# Altium schematic symbol library FPGA_Xilinx_Virtex5.SchLib: 41 symbols (part 6 of 27)
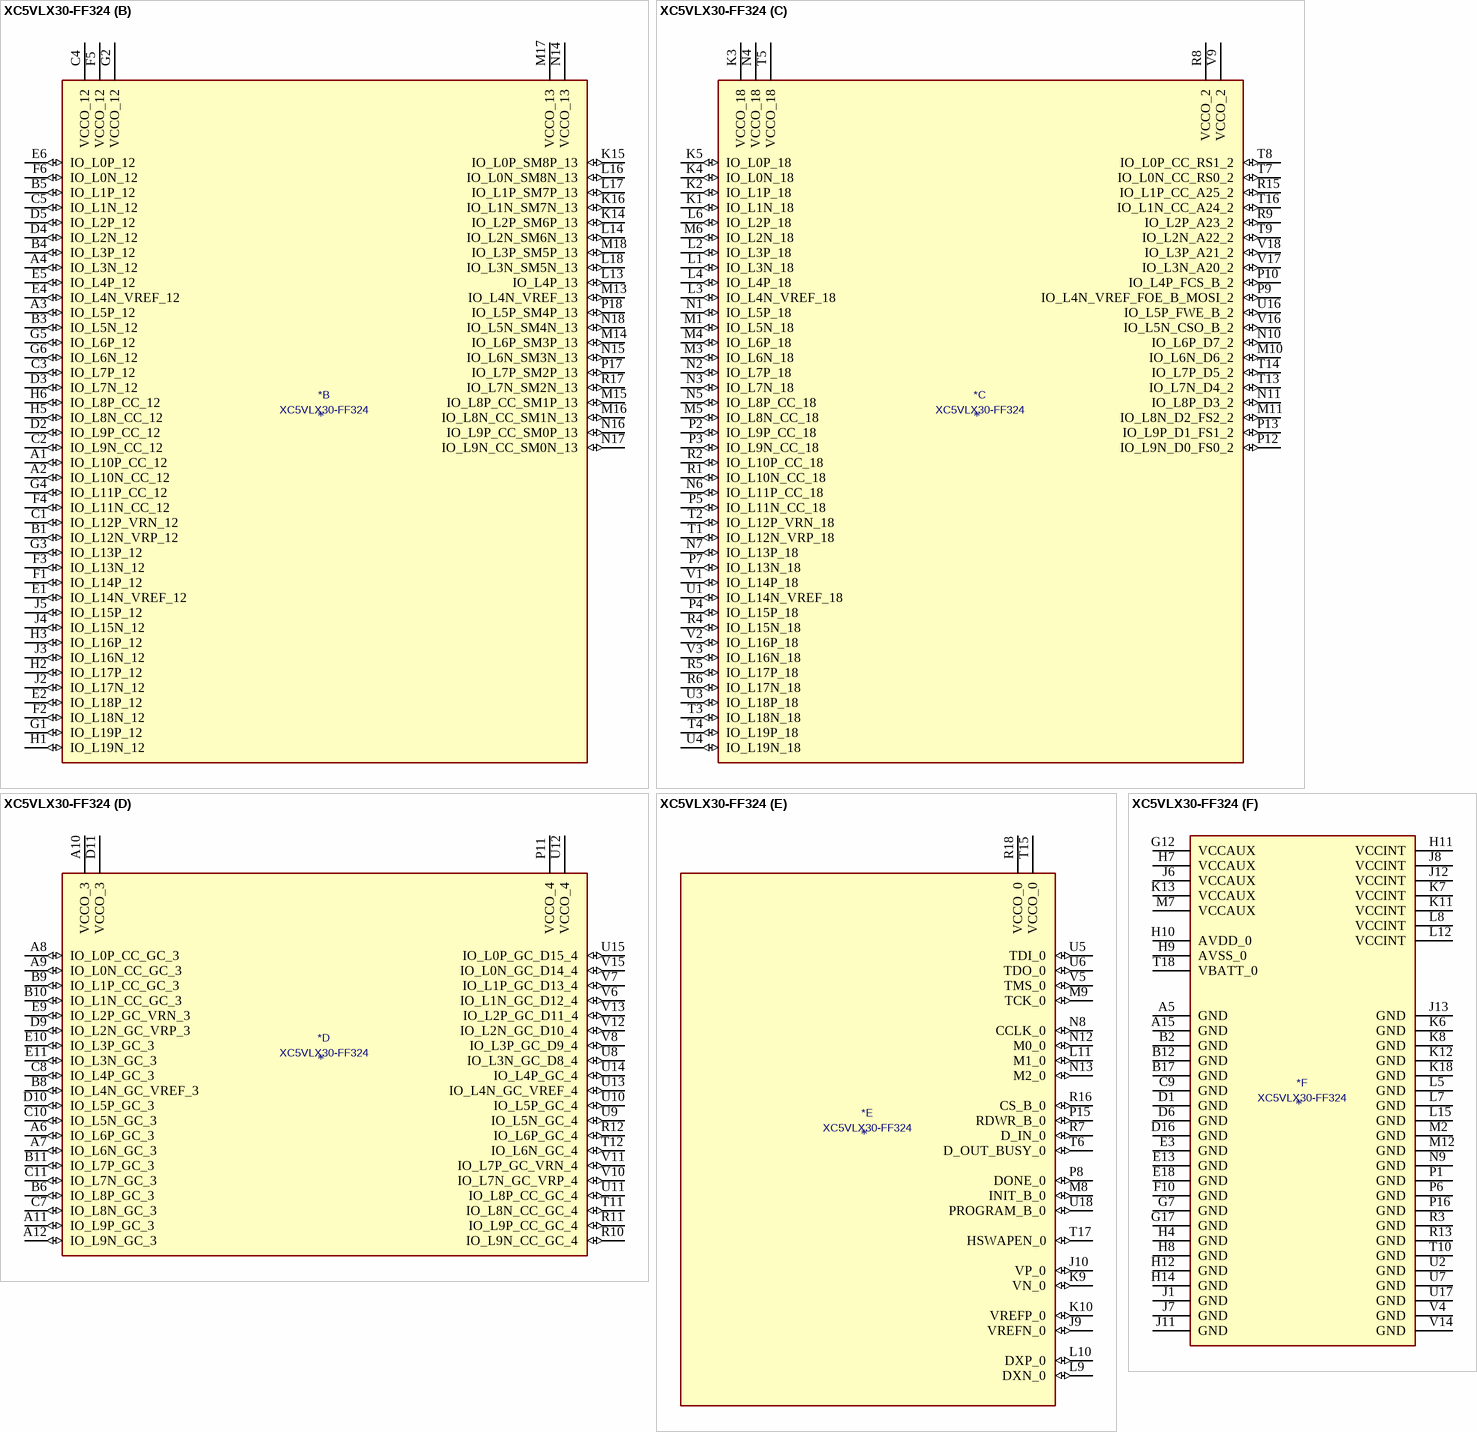
[diagram p142: symbol XC5VLX30-FF324]

## XC5VLX30-FF324
designator *  value XC5VLX30-FF324
ki_keywords: FPGA; ki_description: Virtex 5 LX 30 XC5VLX30-FF324
part A pins: A13 IO_L1P_11 (io), A14 IO_L1N_11 (io), A16 IO_L3N_11 (io), A17 IO_L5P_11 (io), A18 IO_L5N_11 (io), B7 VCCO_1 (power), B13 IO_L6N_11 (io), B14 IO_L2P_11 (io), B15 IO_L2N_11 (io), B16 IO_L3P_11 (io), B18 IO_L7P_11 (io), C6 IO_L9N_CC_A0_D16_1 (io), C12 IO_L4P_A11_D27_1 (io), C13 IO_L6P_11 (io), C14 VCCO_11 (power), C15 IO_L0P_11 (io), C16 IO_L0N_11 (io), C17 IO_L7N_11 (io), C18 IO_L12N_VRP_11 (io), D7 IO_L9P_CC_A1_D17_1 (io), D8 IO_L7P_A5_D21_1 (io), D12 IO_L2N_A14_D30_1 (io), D13 IO_L4N_VREF_A10_D26_1 (io), D14 IO_L4P_11 (io), D15 IO_L11P_CC_SM14P_11 (io), D17 IO_L10N_CC_SM15N_11 (io), D18 IO_L12P_VRN_11 (io), E7 IO_L7N_A4_D20_1 (io), E8 VCCO_1 (power), E12 IO_L2P_A15_D31_1 (io), E14 IO_L4N_VREF_11 (io), E15 IO_L11N_CC_SM14N_11 (io), E16 IO_L9N_CC_11 (io), E17 IO_L10P_CC_SM15P_11 (io), F7 IO_L5N_A8_D24_1 (io), F8 IO_L3P_A13_D29_1 (io), F9 IO_L1N_A16_1 (io), F11 IO_L0P_A19_1 (io), F12 IO_L6P_A7_D23_1 (io), F13 IO_L6N_A6_D22_1 (io), F14 IO_L8P_CC_11 (io), F15 VCCO_11 (power), F16 IO_L9P_CC_11 (io), F17 IO_L14N_VREF_11 (io), F18 IO_L14P_11 (io), G8 IO_L5P_A9_D25_1 (io), G9 IO_L3N_A12_D28_1 (io), G10 IO_L1P_A17_1 (io), G11 IO_L0N_A18_1 (io), G13 IO_L8P_CC_A3_D19_1 (io), G14 IO_L8N_CC_11 (io), G15 IO_L13N_11 (io), G16 IO_L15N_SM13N_11 (io), G18 IO_L16N_SM12N_11 (io), H13 IO_L8N_CC_A2_D18_1 (io), H15 IO_L13P_11 (io), H16 IO_L15P_SM13P_11 (io), H17 IO_L17P_SM11P_11 (io), H18 IO_L16P_SM12P_11 (io), J14 IO_L19N_SM9N_11 (io), J15 IO_L19P_SM9P_11 (io), J16 VCCO_11 (power), J17 IO_L17N_SM11N_11 (io), J18 IO_L18N_SM10N_11 (io), K17 IO_L18P_SM10P_11 (io)
part B pins: A1 IO_L10P_CC_12 (io), A2 IO_L10N_CC_12 (io), A3 IO_L5P_12 (io), A4 IO_L3N_12 (io), B1 IO_L12N_VRP_12 (io), B3 IO_L5N_12 (io), B4 IO_L3P_12 (io), B5 IO_L1P_12 (io), C1 IO_L12P_VRN_12 (io), C2 IO_L9N_CC_12 (io), C3 IO_L7P_12 (io), C4 VCCO_12 (power), C5 IO_L1N_12 (io), D2 IO_L9P_CC_12 (io), D3 IO_L7N_12 (io), D4 IO_L2N_12 (io), D5 IO_L2P_12 (io), E1 IO_L14N_VREF_12 (io), E2 IO_L18P_12 (io), E4 IO_L4N_VREF_12 (io), E5 IO_L4P_12 (io), E6 IO_L0P_12 (io), F1 IO_L14P_12 (io), F2 IO_L18N_12 (io), F3 IO_L13N_12 (io), F4 IO_L11N_CC_12 (io), F5 VCCO_12 (power), F6 IO_L0N_12 (io), G1 IO_L19P_12 (io), G2 VCCO_12 (power), G3 IO_L13P_12 (io), G4 IO_L11P_CC_12 (io), G5 IO_L6P_12 (io), G6 IO_L6N_12 (io), H1 IO_L19N_12 (io), H2 IO_L17P_12 (io), H3 IO_L16P_12 (io), H5 IO_L8N_CC_12 (io), H6 IO_L8P_CC_12 (io), J2 IO_L17N_12 (io), J3 IO_L16N_12 (io), J4 IO_L15N_12 (io), J5 IO_L15P_12 (io), K14 IO_L2P_SM6P_13 (io), K15 IO_L0P_SM8P_13 (io), K16 IO_L1N_SM7N_13 (io), L13 IO_L4P_13 (io), L14 IO_L2N_SM6N_13 (io), L16 IO_L0N_SM8N_13 (io), L17 IO_L1P_SM7P_13 (io), L18 IO_L3N_SM5N_13 (io), M13 IO_L4N_VREF_13 (io), M14 IO_L6P_SM3P_13 (io), M15 IO_L8P_CC_SM1P_13 (io), M16 IO_L8N_CC_SM1N_13 (io), M17 VCCO_13 (power), M18 IO_L3P_SM5P_13 (io), N14 VCCO_13 (power), N15 IO_L6N_SM3N_13 (io), N16 IO_L9P_CC_SM0P_13 (io), N17 IO_L9N_CC_SM0N_13 (io), N18 IO_L5N_SM4N_13 (io), P17 IO_L7P_SM2P_13 (io), P18 IO_L5P_SM4P_13 (io), R17 IO_L7N_SM2N_13 (io)
part C pins: K1 IO_L1N_18 (io), K2 IO_L1P_18 (io), K3 VCCO_18 (power), K4 IO_L0N_18 (io), K5 IO_L0P_18 (io), L1 IO_L3N_18 (io), L2 IO_L3P_18 (io), L3 IO_L4N_VREF_18 (io), L4 IO_L4P_18 (io), L6 IO_L2P_18 (io), M1 IO_L5N_18 (io), M3 IO_L6N_18 (io), M4 IO_L6P_18 (io), M5 IO_L8N_CC_18 (io), M6 IO_L2N_18 (io), M10 IO_L6N_D6_2 (io), M11 IO_L8N_D2_FS2_2 (io), N1 IO_L5P_18 (io), N2 IO_L7P_18 (io), N3 IO_L7N_18 (io), N4 VCCO_18 (power), N5 IO_L8P_CC_18 (io), N6 IO_L11P_CC_18 (io), N7 IO_L13P_18 (io), N10 IO_L6P_D7_2 (io), N11 IO_L8P_D3_2 (io), P2 IO_L9P_CC_18 (io), P3 IO_L9N_CC_18 (io), P4 IO_L15P_18 (io), P5 IO_L11N_CC_18 (io), P7 IO_L13N_18 (io), P9 IO_L4N_VREF_FOE_B_MOSI_2 (io), P10 IO_L4P_FCS_B_2 (io), P12 IO_L9N_D0_FS0_2 (io), P13 IO_L9P_D1_FS1_2 (io), R1 IO_L10N_CC_18 (io), R2 IO_L10P_CC_18 (io), R4 IO_L15N_18 (io), R5 IO_L17P_18 (io), R6 IO_L17N_18 (io), R8 VCCO_2 (power), R9 IO_L2P_A23_2 (io), R15 IO_L1P_CC_A25_2 (io), T1 IO_L12N_VRP_18 (io), T2 IO_L12P_VRN_18 (io), T3 IO_L18N_18 (io), T4 IO_L19P_18 (io), T5 VCCO_18 (power), T7 IO_L0N_CC_RS0_2 (io), T8 IO_L0P_CC_RS1_2 (io), T9 IO_L2N_A22_2 (io), T13 IO_L7N_D4_2 (io), T14 IO_L7P_D5_2 (io), T16 IO_L1N_CC_A24_2 (io), U1 IO_L14N_VREF_18 (io), U3 IO_L18P_18 (io), U4 IO_L19N_18 (io), U16 IO_L5P_FWE_B_2 (io), V1 IO_L14P_18 (io), V2 IO_L16P_18 (io), V3 IO_L16N_18 (io), V9 VCCO_2 (power), V16 IO_L5N_CSO_B_2 (io), V17 IO_L3N_A20_2 (io), V18 IO_L3P_A21_2 (io)
part D pins: A6 IO_L6P_GC_3 (io), A7 IO_L6N_GC_3 (io), A8 IO_L0P_CC_GC_3 (io), A9 IO_L0N_CC_GC_3 (io), A10 VCCO_3 (power), A11 IO_L9P_GC_3 (io), A12 IO_L9N_GC_3 (io), B6 IO_L8P_GC_3 (io), B8 IO_L4N_GC_VREF_3 (io), B9 IO_L1P_CC_GC_3 (io), B10 IO_L1N_CC_GC_3 (io), B11 IO_L7P_GC_3 (io), C7 IO_L8N_GC_3 (io), C8 IO_L4P_GC_3 (io), C10 IO_L5N_GC_3 (io), C11 IO_L7N_GC_3 (io), D9 IO_L2N_GC_VRP_3 (io), D10 IO_L5P_GC_3 (io), D11 VCCO_3 (power), E9 IO_L2P_GC_VRN_3 (io), E10 IO_L3P_GC_3 (io), E11 IO_L3N_GC_3 (io), P11 VCCO_4 (power), R10 IO_L9N_CC_GC_4 (io), R11 IO_L9P_CC_GC_4 (io), R12 IO_L6P_GC_4 (io), T11 IO_L8N_CC_GC_4 (io), T12 IO_L6N_GC_4 (io), U8 IO_L3N_GC_D8_4 (io), U9 IO_L5N_GC_4 (io), U10 IO_L5P_GC_4 (io), U11 IO_L8P_CC_GC_4 (io), U12 VCCO_4 (power), U13 IO_L4N_GC_VREF_4 (io), U14 IO_L4P_GC_4 (io), U15 IO_L0P_GC_D15_4 (io), V6 IO_L1N_GC_D12_4 (io), V7 IO_L1P_GC_D13_4 (io), V8 IO_L3P_GC_D9_4 (io), V10 IO_L7N_GC_VRP_4 (io), V11 IO_L7P_GC_VRN_4 (io), V12 IO_L2N_GC_D10_4 (io), V13 IO_L2P_GC_D11_4 (io), V15 IO_L0N_GC_D14_4 (io)
part E pins: J9 VREFN_0 (io), J10 VP_0 (io), K9 VN_0 (io), K10 VREFP_0 (io), L9 DXN_0 (io), L10 DXP_0 (io), L11 M1_0 (io), M8 INIT_B_0 (io), M9 TCK_0 (io), N8 CCLK_0 (io), N12 M0_0 (io), N13 M2_0 (io), P8 DONE_0 (io), P15 RDWR_B_0 (io), R7 D_IN_0 (io), R16 CS_B_0 (io), R18 VCCO_0 (power), T6 D_OUT_BUSY_0 (io), T15 VCCO_0 (power), T17 HSWAPEN_0 (io), U5 TDI_0 (io), U6 TDO_0 (io), U18 PROGRAM_B_0 (io), V5 TMS_0 (io)
part F pins: A5 GND (power), A15 GND (power), B2 GND (power), B12 GND (power), B17 GND (power), C9 GND (power), D1 GND (power), D6 GND (power), D16 GND (power), E3 GND (power), E13 GND (power), E18 GND (power), F10 GND (power), G7 GND (power), G12 VCCAUX (power), G17 GND (power), H4 GND (power), H7 VCCAUX (power), H8 GND (power), H9 AVSS_0 (power), H10 AVDD_0 (power), H11 VCCINT (power), H12 GND (power), H14 GND (power), J1 GND (power), J6 VCCAUX (power), J7 GND (power), J8 VCCINT (power), J11 GND (power), J12 VCCINT (power), J13 GND (power), K6 GND (power), K7 VCCINT (power), K8 GND (power), K11 VCCINT (power), K12 GND (power), K13 VCCAUX (power), K18 GND (power), L5 GND (power), L7 GND (power), L8 VCCINT (power), L12 VCCINT (power), L15 GND (power), M2 GND (power), M7 VCCAUX (power), M12 GND (power), N9 GND (power), P1 GND (power), P6 GND (power), P16 GND (power), R3 GND (power), R13 GND (power), T10 GND (power), T18 VBATT_0 (power), U2 GND (power), U7 GND (power), U17 GND (power), V4 GND (power), V14 GND (power)

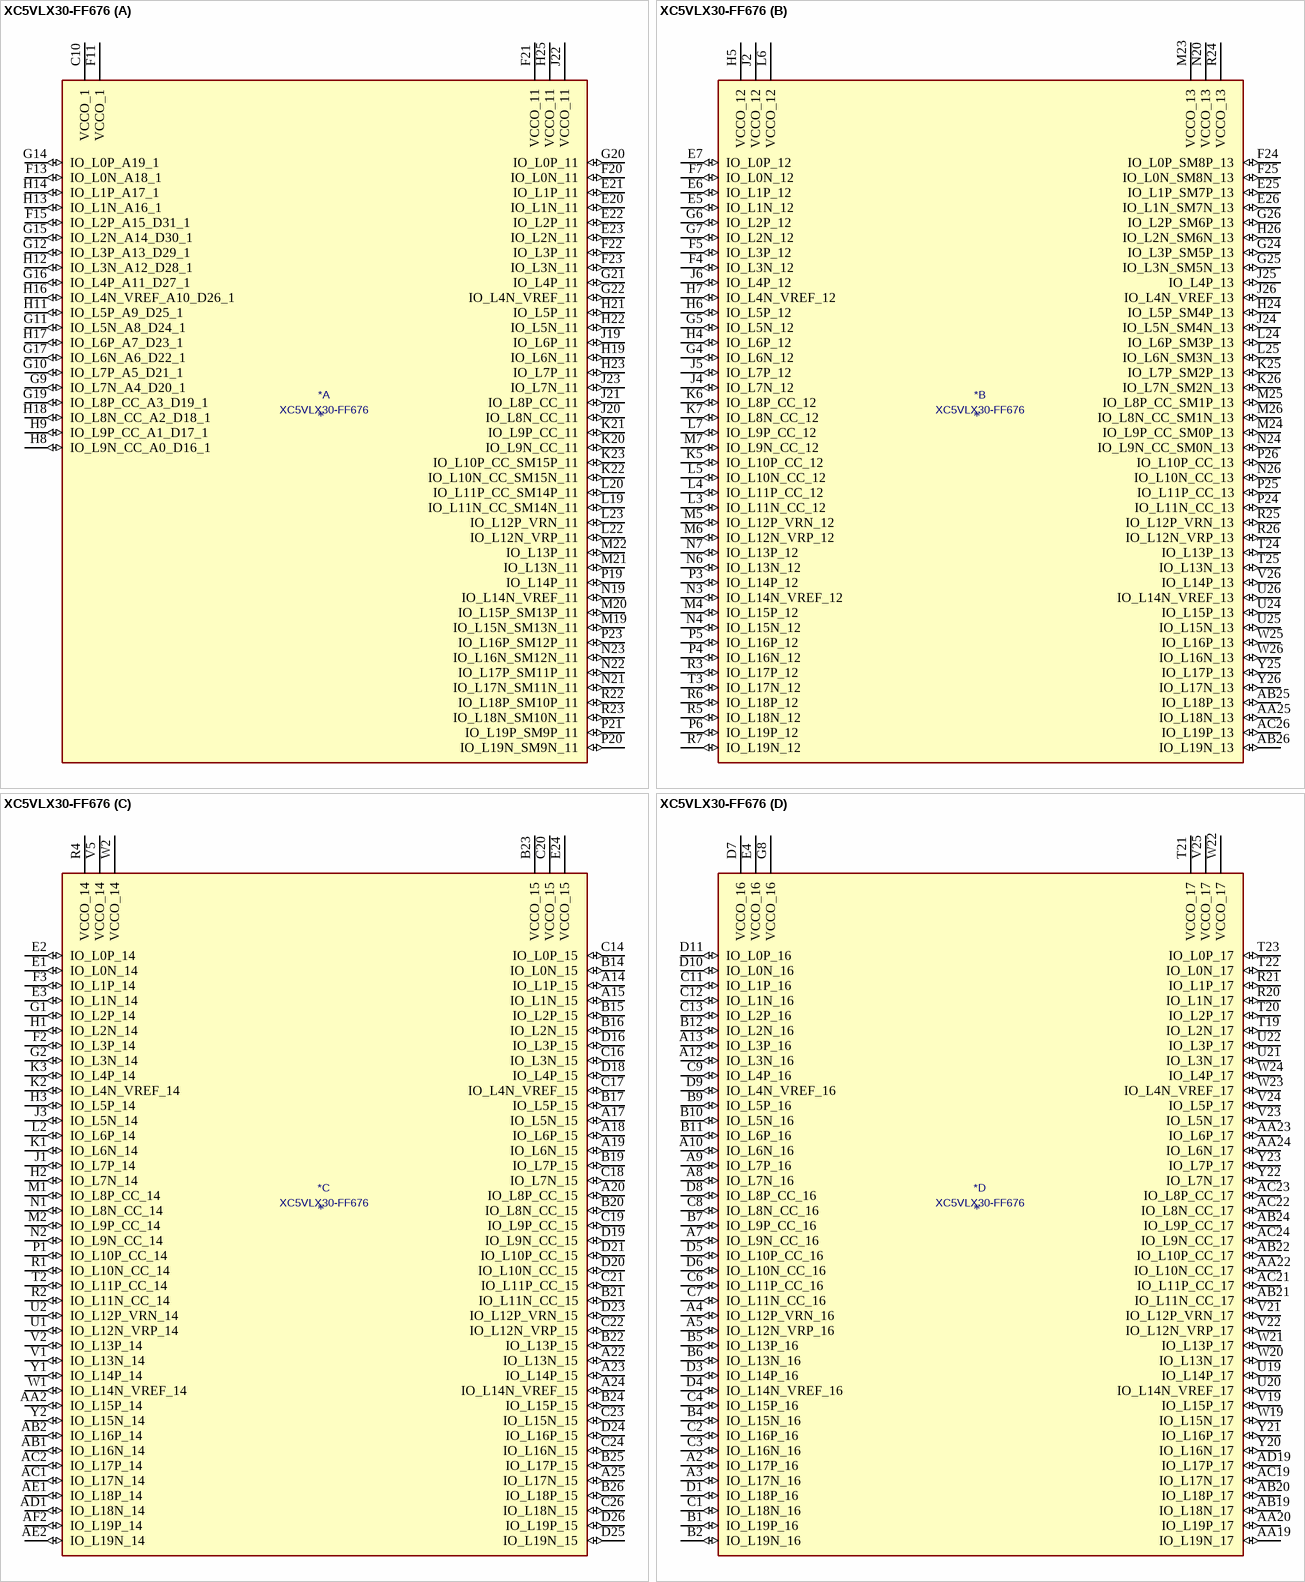
[diagram p28: symbol XC5VLX30-FF676]

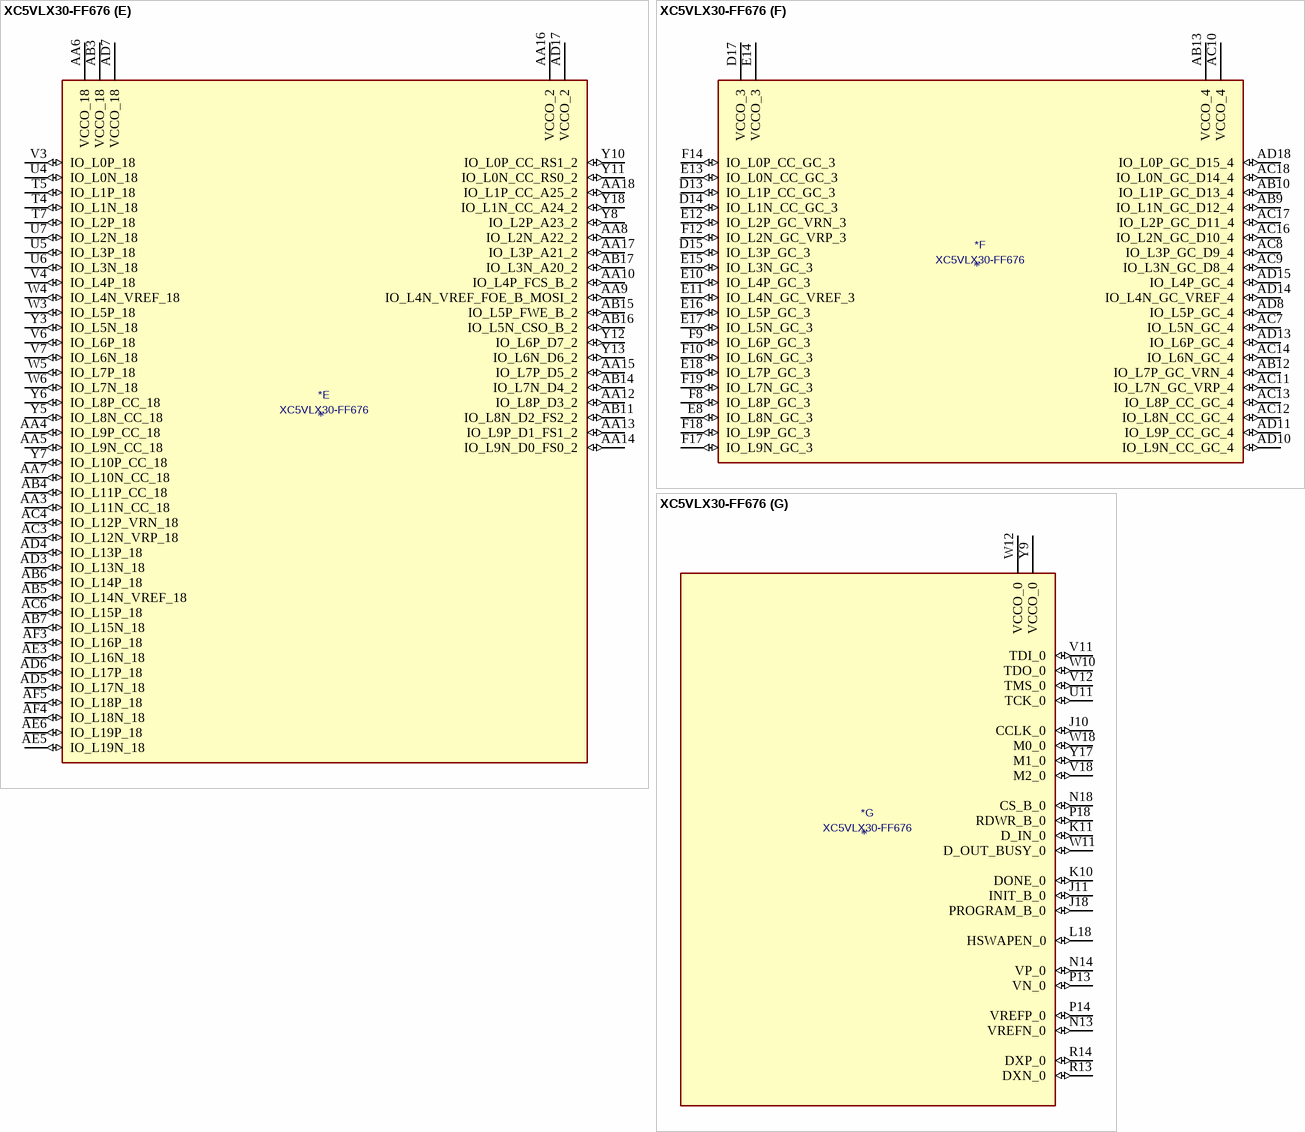
[diagram p29: symbol XC5VLX30-FF676]

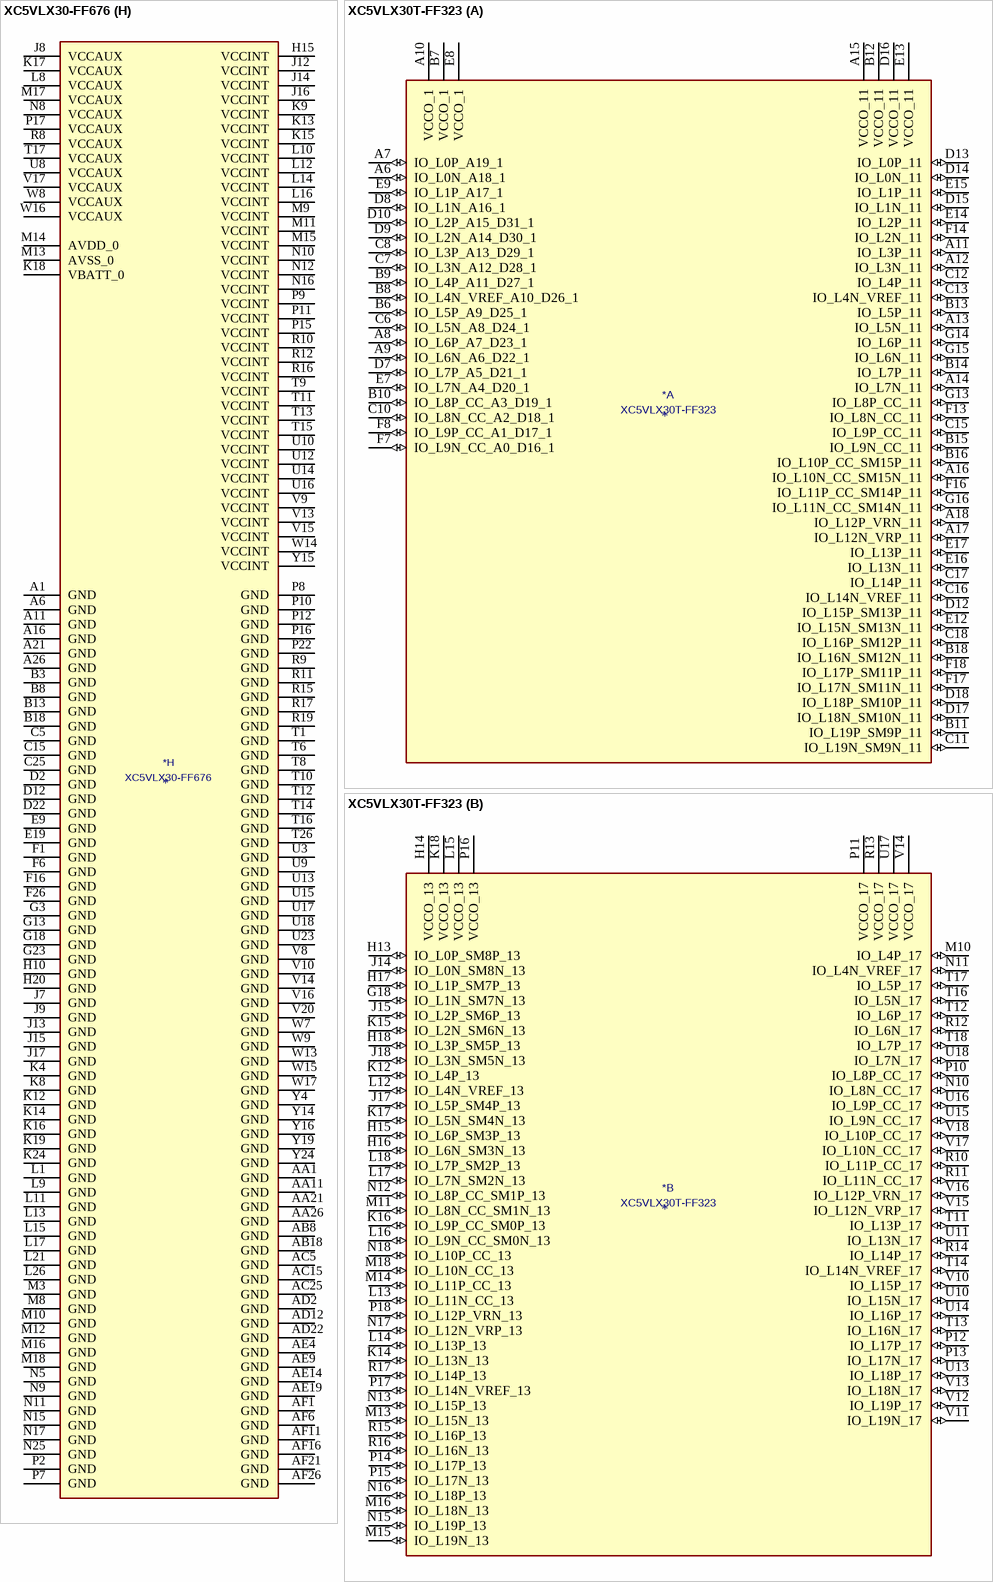
[diagram p30: symbols XC5VLX30-FF676 to XC5VLX30T-FF323]

## XC5VLX30-FF676
designator *  value XC5VLX30-FF676
ki_keywords: FPGA; ki_description: Virtex 5 LX 30 XC5VLX30-FF676
part A pins: C10 VCCO_1 (power), E20 IO_L1N_11 (io), E21 IO_L1P_11 (io), E22 IO_L2P_11 (io), E23 IO_L2N_11 (io), F11 VCCO_1 (power), F13 IO_L0N_A18_1 (io), F15 IO_L2P_A15_D31_1 (io), F20 IO_L0N_11 (io), F21 VCCO_11 (power), F22 IO_L3P_11 (io), F23 IO_L3N_11 (io), G9 IO_L7N_A4_D20_1 (io), G10 IO_L7P_A5_D21_1 (io), G11 IO_L5N_A8_D24_1 (io), G12 IO_L3P_A13_D29_1 (io), G14 IO_L0P_A19_1 (io), G15 IO_L2N_A14_D30_1 (io), G16 IO_L4P_A11_D27_1 (io), G17 IO_L6N_A6_D22_1 (io), G19 IO_L8P_CC_A3_D19_1 (io), G20 IO_L0P_11 (io), G21 IO_L4P_11 (io), G22 IO_L4N_VREF_11 (io), H8 IO_L9N_CC_A0_D16_1 (io), H9 IO_L9P_CC_A1_D17_1 (io), H11 IO_L5P_A9_D25_1 (io), H12 IO_L3N_A12_D28_1 (io), H13 IO_L1N_A16_1 (io), H14 IO_L1P_A17_1 (io), H16 IO_L4N_VREF_A10_D26_1 (io), H17 IO_L6P_A7_D23_1 (io), H18 IO_L8N_CC_A2_D18_1 (io), H19 IO_L6N_11 (io), H21 IO_L5P_11 (io), H22 IO_L5N_11 (io), H23 IO_L7P_11 (io), H25 VCCO_11 (power), J19 IO_L6P_11 (io), J20 IO_L8N_CC_11 (io), J21 IO_L8P_CC_11 (io), J22 VCCO_11 (power), J23 IO_L7N_11 (io), K20 IO_L9N_CC_11 (io), K21 IO_L9P_CC_11 (io), K22 IO_L10N_CC_SM15N_11 (io), K23 IO_L10P_CC_SM15P_11 (io), L19 IO_L11N_CC_SM14N_11 (io), L20 IO_L11P_CC_SM14P_11 (io), L22 IO_L12N_VRP_11 (io), L23 IO_L12P_VRN_11 (io), M19 IO_L15N_SM13N_11 (io), M20 IO_L15P_SM13P_11 (io), M21 IO_L13N_11 (io), M22 IO_L13P_11 (io), N19 IO_L14N_VREF_11 (io), N21 IO_L17N_SM11N_11 (io), N22 IO_L17P_SM11P_11 (io), N23 IO_L16N_SM12N_11 (io), P19 IO_L14P_11 (io), P20 IO_L19N_SM9N_11 (io), P21 IO_L19P_SM9P_11 (io), P23 IO_L16P_SM12P_11 (io), R22 IO_L18P_SM10P_11 (io), R23 IO_L18N_SM10N_11 (io)
part B pins: AA25 IO_L18N_13 (io), AB25 IO_L18P_13 (io), AB26 IO_L19N_13 (io), AC26 IO_L19P_13 (io), E5 IO_L1N_12 (io), E6 IO_L1P_12 (io), E7 IO_L0P_12 (io), E25 IO_L1P_SM7P_13 (io), E26 IO_L1N_SM7N_13 (io), F4 IO_L3N_12 (io), F5 IO_L3P_12 (io), F7 IO_L0N_12 (io), F24 IO_L0P_SM8P_13 (io), F25 IO_L0N_SM8N_13 (io), G4 IO_L6N_12 (io), G5 IO_L5N_12 (io), G6 IO_L2P_12 (io), G7 IO_L2N_12 (io), G24 IO_L3P_SM5P_13 (io), G25 IO_L3N_SM5N_13 (io), G26 IO_L2P_SM6P_13 (io), H4 IO_L6P_12 (io), H5 VCCO_12 (power), H6 IO_L5P_12 (io), H7 IO_L4N_VREF_12 (io), H24 IO_L5P_SM4P_13 (io), H26 IO_L2N_SM6N_13 (io), J2 VCCO_12 (power), J4 IO_L7N_12 (io), J5 IO_L7P_12 (io), J6 IO_L4P_12 (io), J24 IO_L5N_SM4N_13 (io), J25 IO_L4P_13 (io), J26 IO_L4N_VREF_13 (io), K5 IO_L10P_CC_12 (io), K6 IO_L8P_CC_12 (io), K7 IO_L8N_CC_12 (io), K25 IO_L7P_SM2P_13 (io), K26 IO_L7N_SM2N_13 (io), L3 IO_L11N_CC_12 (io), L4 IO_L11P_CC_12 (io), L5 IO_L10N_CC_12 (io), L6 VCCO_12 (power), L7 IO_L9P_CC_12 (io), L24 IO_L6P_SM3P_13 (io), L25 IO_L6N_SM3N_13 (io), M4 IO_L15P_12 (io), M5 IO_L12P_VRN_12 (io), M6 IO_L12N_VRP_12 (io), M7 IO_L9N_CC_12 (io), M23 VCCO_13 (power), M24 IO_L9P_CC_SM0P_13 (io), M25 IO_L8P_CC_SM1P_13 (io), M26 IO_L8N_CC_SM1N_13 (io), N3 IO_L14N_VREF_12 (io), N4 IO_L15N_12 (io), N6 IO_L13N_12 (io), N7 IO_L13P_12 (io), N20 VCCO_13 (power), N24 IO_L9N_CC_SM0N_13 (io), N26 IO_L10N_CC_13 (io), P3 IO_L14P_12 (io), P4 IO_L16N_12 (io), P5 IO_L16P_12 (io), P6 IO_L19P_12 (io), P24 IO_L11N_CC_13 (io), P25 IO_L11P_CC_13 (io), P26 IO_L10P_CC_13 (io), R3 IO_L17P_12 (io), R5 IO_L18N_12 (io), R6 IO_L18P_12 (io), R7 IO_L19N_12 (io), R24 VCCO_13 (power), R25 IO_L12P_VRN_13 (io), R26 IO_L12N_VRP_13 (io), T3 IO_L17N_12 (io), T24 IO_L13P_13 (io), T25 IO_L13N_13 (io), U24 IO_L15P_13 (io), U25 IO_L15N_13 (io), U26 IO_L14N_VREF_13 (io), V26 IO_L14P_13 (io), W25 IO_L16P_13 (io), W26 IO_L16N_13 (io), Y25 IO_L17P_13 (io), Y26 IO_L17N_13 (io)
part C pins: A14 IO_L1P_15 (io), A15 IO_L1N_15 (io), A17 IO_L5N_15 (io), A18 IO_L6P_15 (io), A19 IO_L6N_15 (io), A20 IO_L8P_CC_15 (io), A22 IO_L13N_15 (io), A23 IO_L14P_15 (io), A24 IO_L14N_VREF_15 (io), A25 IO_L17N_15 (io), AA2 IO_L15P_14 (io), AB1 IO_L16N_14 (io), AB2 IO_L16P_14 (io), AC1 IO_L17N_14 (io), AC2 IO_L17P_14 (io), AD1 IO_L18N_14 (io), AE1 IO_L18P_14 (io), AE2 IO_L19N_14 (io), AF2 IO_L19P_14 (io), B14 IO_L0N_15 (io), B15 IO_L2P_15 (io), B16 IO_L2N_15 (io), B17 IO_L5P_15 (io), B19 IO_L7P_15 (io), B20 IO_L8N_CC_15 (io), B21 IO_L11N_CC_15 (io), B22 IO_L13P_15 (io), B23 VCCO_15 (power), B24 IO_L15P_15 (io), B25 IO_L17P_15 (io), B26 IO_L18P_15 (io), C14 IO_L0P_15 (io), C16 IO_L3N_15 (io), C17 IO_L4N_VREF_15 (io), C18 IO_L7N_15 (io), C19 IO_L9P_CC_15 (io), C20 VCCO_15 (power), C21 IO_L11P_CC_15 (io), C22 IO_L12N_VRP_15 (io), C23 IO_L15N_15 (io), C24 IO_L16N_15 (io), C26 IO_L18N_15 (io), D16 IO_L3P_15 (io), D18 IO_L4P_15 (io), D19 IO_L9N_CC_15 (io), D20 IO_L10N_CC_15 (io), D21 IO_L10P_CC_15 (io), D23 IO_L12P_VRN_15 (io), D24 IO_L16P_15 (io), D25 IO_L19N_15 (io), D26 IO_L19P_15 (io), E1 IO_L0N_14 (io), E2 IO_L0P_14 (io), E3 IO_L1N_14 (io), E24 VCCO_15 (power), F2 IO_L3P_14 (io), F3 IO_L1P_14 (io), G1 IO_L2P_14 (io), G2 IO_L3N_14 (io), H1 IO_L2N_14 (io), H2 IO_L7N_14 (io), H3 IO_L5P_14 (io), J1 IO_L7P_14 (io), J3 IO_L5N_14 (io), K1 IO_L6N_14 (io), K2 IO_L4N_VREF_14 (io), K3 IO_L4P_14 (io), L2 IO_L6P_14 (io), M1 IO_L8P_CC_14 (io), M2 IO_L9P_CC_14 (io), N1 IO_L8N_CC_14 (io), N2 IO_L9N_CC_14 (io), P1 IO_L10P_CC_14 (io), R1 IO_L10N_CC_14 (io), R2 IO_L11N_CC_14 (io), R4 VCCO_14 (power), T2 IO_L11P_CC_14 (io), U1 IO_L12N_VRP_14 (io), U2 IO_L12P_VRN_14 (io), V1 IO_L13N_14 (io), V2 IO_L13P_14 (io), V5 VCCO_14 (power), W1 IO_L14N_VREF_14 (io), W2 VCCO_14 (power), Y1 IO_L14P_14 (io), Y2 IO_L15N_14 (io)
part D pins: A2 IO_L17P_16 (io), A3 IO_L17N_16 (io), A4 IO_L12P_VRN_16 (io), A5 IO_L12N_VRP_16 (io), A7 IO_L9N_CC_16 (io), A8 IO_L7N_16 (io), A9 IO_L7P_16 (io), A10 IO_L6N_16 (io), A12 IO_L3N_16 (io), A13 IO_L3P_16 (io), AA19 IO_L19N_17 (io), AA20 IO_L19P_17 (io), AA22 IO_L10N_CC_17 (io), AA23 IO_L6P_17 (io), AA24 IO_L6N_17 (io), AB19 IO_L18N_17 (io), AB20 IO_L18P_17 (io), AB21 IO_L11N_CC_17 (io), AB22 IO_L10P_CC_17 (io), AB24 IO_L9P_CC_17 (io), AC19 IO_L17N_17 (io), AC21 IO_L11P_CC_17 (io), AC22 IO_L8N_CC_17 (io), AC23 IO_L8P_CC_17 (io), AC24 IO_L9N_CC_17 (io), AD19 IO_L17P_17 (io), B1 IO_L19P_16 (io), B2 IO_L19N_16 (io), B4 IO_L15N_16 (io), B5 IO_L13P_16 (io), B6 IO_L13N_16 (io), B7 IO_L9P_CC_16 (io), B9 IO_L5P_16 (io), B10 IO_L5N_16 (io), B11 IO_L6P_16 (io), B12 IO_L2N_16 (io), C1 IO_L18N_16 (io), C2 IO_L16P_16 (io), C3 IO_L16N_16 (io), C4 IO_L15P_16 (io), C6 IO_L11P_CC_16 (io), C7 IO_L11N_CC_16 (io), C8 IO_L8N_CC_16 (io), C9 IO_L4P_16 (io), C11 IO_L1P_16 (io), C12 IO_L1N_16 (io), C13 IO_L2P_16 (io), D1 IO_L18P_16 (io), D3 IO_L14P_16 (io), D4 IO_L14N_VREF_16 (io), D5 IO_L10P_CC_16 (io), D6 IO_L10N_CC_16 (io), D7 VCCO_16 (power), D8 IO_L8P_CC_16 (io), D9 IO_L4N_VREF_16 (io), D10 IO_L0N_16 (io), D11 IO_L0P_16 (io), E4 VCCO_16 (power), G8 VCCO_16 (power), R20 IO_L1N_17 (io), R21 IO_L1P_17 (io), T19 IO_L2N_17 (io), T20 IO_L2P_17 (io), T21 VCCO_17 (power), T22 IO_L0N_17 (io), T23 IO_L0P_17 (io), U19 IO_L14P_17 (io), U20 IO_L14N_VREF_17 (io), U21 IO_L3N_17 (io), U22 IO_L3P_17 (io), V19 IO_L15P_17 (io), V21 IO_L12P_VRN_17 (io), V22 IO_L12N_VRP_17 (io), V23 IO_L5N_17 (io), V24 IO_L5P_17 (io), V25 VCCO_17 (power), W19 IO_L15N_17 (io), W20 IO_L13N_17 (io), W21 IO_L13P_17 (io), W22 VCCO_17 (power), W23 IO_L4N_VREF_17 (io), W24 IO_L4P_17 (io), Y20 IO_L16N_17 (io), Y21 IO_L16P_17 (io), Y22 IO_L7N_17 (io), Y23 IO_L7P_17 (io)
part E pins: AA3 IO_L11N_CC_18 (io), AA4 IO_L9P_CC_18 (io), AA5 IO_L9N_CC_18 (io), AA6 VCCO_18 (power), AA7 IO_L10N_CC_18 (io), AA8 IO_L2N_A22_2 (io), AA9 IO_L4N_VREF_FOE_B_MOSI_2 (io), AA10 IO_L4P_FCS_B_2 (io), AA12 IO_L8P_D3_2 (io), AA13 IO_L9P_D1_FS1_2 (io), AA14 IO_L9N_D0_FS0_2 (io), AA15 IO_L7P_D5_2 (io), AA16 VCCO_2 (power), AA17 IO_L3P_A21_2 (io), AA18 IO_L1P_CC_A25_2 (io), AB3 VCCO_18 (power), AB4 IO_L11P_CC_18 (io), AB5 IO_L14N_VREF_18 (io), AB6 IO_L14P_18 (io), AB7 IO_L15N_18 (io), AB11 IO_L8N_D2_FS2_2 (io), AB14 IO_L7N_D4_2 (io), AB15 IO_L5P_FWE_B_2 (io), AB16 IO_L5N_CSO_B_2 (io), AB17 IO_L3N_A20_2 (io), AC3 IO_L12N_VRP_18 (io), AC4 IO_L12P_VRN_18 (io), AC6 IO_L15P_18 (io), AD3 IO_L13N_18 (io), AD4 IO_L13P_18 (io), AD5 IO_L17N_18 (io), AD6 IO_L17P_18 (io), AD7 VCCO_18 (power), AD17 VCCO_2 (power), AE3 IO_L16N_18 (io), AE5 IO_L19N_18 (io), AE6 IO_L19P_18 (io), AF3 IO_L16P_18 (io), AF4 IO_L18N_18 (io), AF5 IO_L18P_18 (io), T4 IO_L1N_18 (io), T5 IO_L1P_18 (io), T7 IO_L2P_18 (io), U4 IO_L0N_18 (io), U5 IO_L3P_18 (io), U6 IO_L3N_18 (io), U7 IO_L2N_18 (io), V3 IO_L0P_18 (io), V4 IO_L4P_18 (io), V6 IO_L6P_18 (io), V7 IO_L6N_18 (io), W3 IO_L5P_18 (io), W4 IO_L4N_VREF_18 (io), W5 IO_L7P_18 (io), W6 IO_L7N_18 (io), Y3 IO_L5N_18 (io), Y5 IO_L8N_CC_18 (io), Y6 IO_L8P_CC_18 (io), Y7 IO_L10P_CC_18 (io), Y8 IO_L2P_A23_2 (io), Y10 IO_L0P_CC_RS1_2 (io), Y11 IO_L0N_CC_RS0_2 (io), Y12 IO_L6P_D7_2 (io), Y13 IO_L6N_D6_2 (io), Y18 IO_L1N_CC_A24_2 (io)
part F pins: AB9 IO_L1N_GC_D12_4 (io), AB10 IO_L1P_GC_D13_4 (io), AB12 IO_L7P_GC_VRN_4 (io), AB13 VCCO_4 (power), AC7 IO_L5N_GC_4 (io), AC8 IO_L3P_GC_D9_4 (io), AC9 IO_L3N_GC_D8_4 (io), AC10 VCCO_4 (power), AC11 IO_L7N_GC_VRP_4 (io), AC12 IO_L8N_CC_GC_4 (io), AC13 IO_L8P_CC_GC_4 (io), AC14 IO_L6N_GC_4 (io), AC16 IO_L2N_GC_D10_4 (io), AC17 IO_L2P_GC_D11_4 (io), AC18 IO_L0N_GC_D14_4 (io), AD8 IO_L5P_GC_4 (io), AD10 IO_L9N_CC_GC_4 (io), AD11 IO_L9P_CC_GC_4 (io), AD13 IO_L6P_GC_4 (io), AD14 IO_L4N_GC_VREF_4 (io), AD15 IO_L4P_GC_4 (io), AD18 IO_L0P_GC_D15_4 (io), D13 IO_L1P_CC_GC_3 (io), D14 IO_L1N_CC_GC_3 (io), D15 IO_L3P_GC_3 (io), D17 VCCO_3 (power), E8 IO_L8N_GC_3 (io), E10 IO_L4P_GC_3 (io), E11 IO_L4N_GC_VREF_3 (io), E12 IO_L2P_GC_VRN_3 (io), E13 IO_L0N_CC_GC_3 (io), E14 VCCO_3 (power), E15 IO_L3N_GC_3 (io), E16 IO_L5P_GC_3 (io), E17 IO_L5N_GC_3 (io), E18 IO_L7P_GC_3 (io), F8 IO_L8P_GC_3 (io), F9 IO_L6P_GC_3 (io), F10 IO_L6N_GC_3 (io), F12 IO_L2N_GC_VRP_3 (io), F14 IO_L0P_CC_GC_3 (io), F17 IO_L9N_GC_3 (io), F18 IO_L9P_GC_3 (io), F19 IO_L7N_GC_3 (io)